# Altium footprint library WE-SHC.PcbLib: 139 footprints (part 5 of 10)
Each footprint in its own frame and in the unit in brackets; x right, y up, seen from the top. Pads: shape width x height; smd on the part's side, far side on the other; paste and mask are expansions set on the pad; w line width, h text height; cw(c..) or ccw(c..) is an arc to the next point about the centre after c.
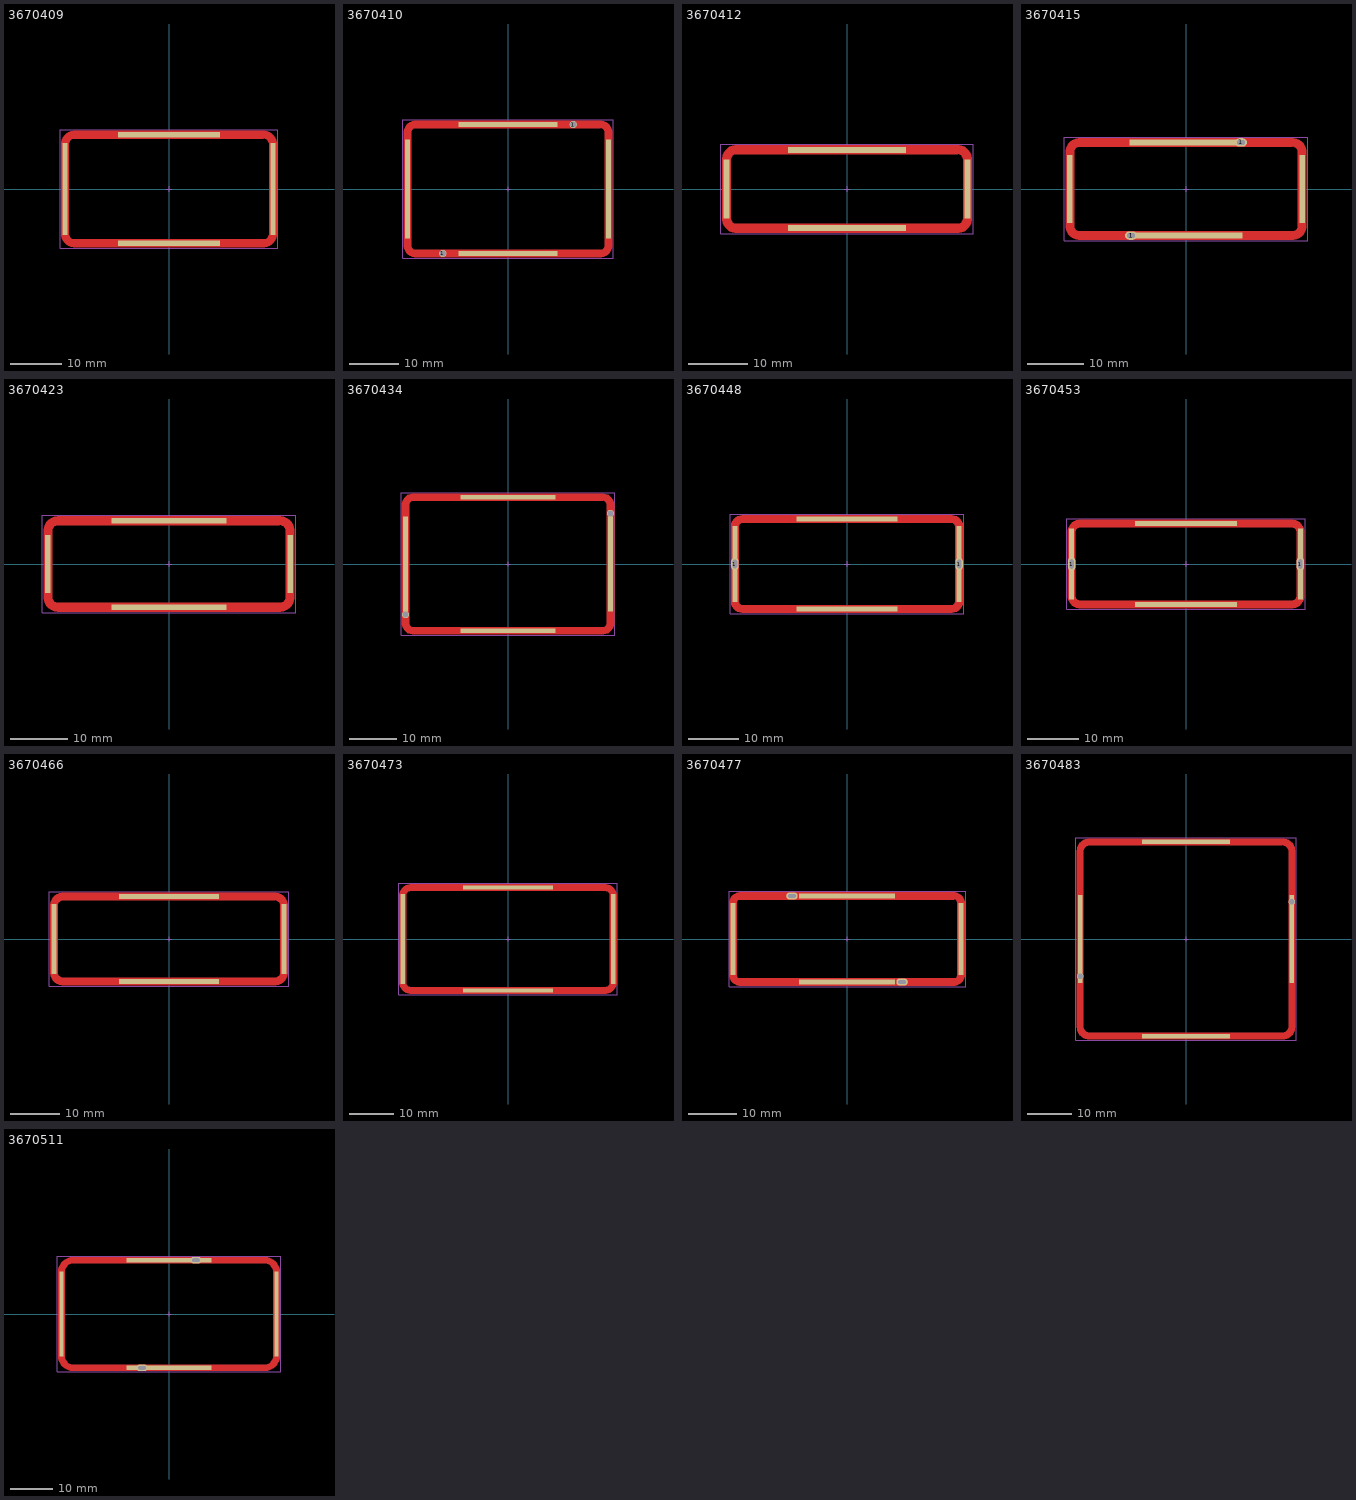
[diagram p4: the footprints below, top view; thin cyan lines are the x and y axes]

## 3670409 [mm] "Shielding Cabinet, SMT Frame Seamless, 40.9x21.5x2.5mm"
height 2.5
pads (4):
  rect 1x18 smd paste-2539.97 mask-2222: 1(-20.3,0) 1(20.3,0)
  rect 20x1 smd paste-2539.97 mask-2222: 1(0,-10.6) 1(0,10.6)
Top Layer:
  region: -21.05,-1 -21.05,8.75 -21.05,9.006 -20.95,9.508 -20.754,9.982 -20.47,10.407 -20.107,10.77 -19.682,11.054 -19.208,11.25 -18.706,11.35 -18.45,11.35 18.45,11.35 18.706,11.35 19.208,11.25 19.682,11.054 20.107,10.77 20.47,10.407 20.754,9.982 20.95,9.508 21.05,9.006 21.05,8.75 21.05,-1 19.55,-1 19.55,8.75 19.545,8.858 19.503,9.069 19.42,9.269 19.3,9.448 19.148,9.6 18.969,9.72 18.769,9.803 18.558,9.845 18.45,9.85 -18.45,9.85 -18.558,9.845 -18.769,9.803 -18.969,9.72 -19.148,9.6 -19.3,9.448 -19.42,9.269 -19.503,9.069 -19.545,8.858 -19.55,8.75 -19.55,-1
  region: -21.05,-0.25 -21.05,-8.75 -21.05,-9.006 -20.95,-9.508 -20.754,-9.982 -20.47,-10.407 -20.107,-10.77 -19.682,-11.054 -19.208,-11.25 -18.706,-11.35 -18.45,-11.35 18.45,-11.35 18.706,-11.35 19.208,-11.25 19.682,-11.054 20.107,-10.77 20.47,-10.407 20.754,-9.982 20.95,-9.508 21.05,-9.006 21.05,-8.75 21.05,-0.25 19.55,-0.25 19.55,-8.75 19.545,-8.858 19.503,-9.069 19.42,-9.269 19.3,-9.448 19.148,-9.6 18.969,-9.72 18.769,-9.803 18.558,-9.845 18.45,-9.85 -18.45,-9.85 -18.558,-9.845 -18.769,-9.803 -18.969,-9.72 -19.148,-9.6 -19.3,-9.448 -19.42,-9.269 -19.503,-9.069 -19.545,-8.858 -19.55,-8.75 -19.55,-0.25
Top Paste:
  region: -21.05,-0.25 -21.05,-8.75 -21.05,-9.006 -20.95,-9.508 -20.754,-9.982 -20.47,-10.407 -20.107,-10.77 -19.682,-11.054 -19.208,-11.25 -18.706,-11.35 -18.45,-11.35 18.45,-11.35 18.706,-11.35 19.208,-11.25 19.682,-11.054 20.107,-10.77 20.47,-10.407 20.754,-9.982 20.95,-9.508 21.05,-9.006 21.05,-8.75 21.05,-0.25 19.55,-0.25 19.55,-8.75 19.545,-8.858 19.503,-9.069 19.42,-9.269 19.3,-9.448 19.148,-9.6 18.969,-9.72 18.769,-9.803 18.558,-9.845 18.45,-9.85 -18.45,-9.85 -18.558,-9.845 -18.769,-9.803 -18.969,-9.72 -19.148,-9.6 -19.3,-9.448 -19.42,-9.269 -19.503,-9.069 -19.545,-8.858 -19.55,-8.75 -19.55,-0.25
  region: -21.05,0.25 -21.05,8.75 -21.05,9.006 -20.95,9.508 -20.754,9.982 -20.47,10.407 -20.107,10.77 -19.682,11.054 -19.208,11.25 -18.706,11.35 -18.45,11.35 18.45,11.35 18.706,11.35 19.208,11.25 19.682,11.054 20.107,10.77 20.47,10.407 20.754,9.982 20.95,9.508 21.05,9.006 21.05,8.75 21.05,0.25 19.55,0.25 19.55,8.75 19.545,8.858 19.503,9.069 19.42,9.269 19.3,9.448 19.148,9.6 18.969,9.72 18.769,9.803 18.558,9.845 18.45,9.85 -18.45,9.85 -18.558,9.845 -18.769,9.803 -18.969,9.72 -19.148,9.6 -19.3,9.448 -19.42,9.269 -19.503,9.069 -19.545,8.858 -19.55,8.75 -19.55,0.25
Notes:
  text "recommended tin paste thickness=0.5mm / customer to define the final stencil gap" at -6.15,-13 h0.4
Top Designator:
  text ".Designator" at -7.498,-0.5 h1.5
Top Component Outline:
  lines w0.1: -20.45,-8.75 ccw(c-18.45,-8.75) -18.45,-10.75 18.45,-10.75 ccw(c18.45,-8.75) 20.45,-8.75 20.45,8.75 ccw(c18.45,8.75) 18.45,10.75 -18.45,10.75 ccw(c-18.45,8.75) -20.45,8.75 -20.45,-8.75
Top 3D Body:
  lines w0.1: -20.45,-8.75 ccw(c-18.45,-8.75) -18.45,-10.75 18.45,-10.75 ccw(c18.45,-8.75) 20.45,-8.75 20.45,8.75 ccw(c18.45,8.75) 18.45,10.75 -18.45,10.75 ccw(c-18.45,8.75) -20.45,8.75 -20.45,-8.75
Top Courtyard:
  lines w0.05: -0.5,0 0.5,0 ; 0,-0.5 0,0.5 ; -21.25,-11.55 -21.25,11.55 21.25,11.55 21.25,-11.55 -21.25,-11.55
3D body "3670409.stp": height 2.5, standoff 0, extent -20.45,-10.75 20.45,10.75

## 3670410 [mm] "Shielding Cabinet, SMT Frame Seamless, 41x26.4x3.7mm"
height 3.7
pads (6):
  rect 1x20 smd paste-2539.97 mask-2222: 1(-20.35,0) 1(20.35,0)
  round 1.5 hole 1.3: 1(-13.2,-13.05) 1(13.2,13.05)
  rect 20x1 smd paste-2539.97 mask-2222: 1(0,-13.05) 1(0,13.05)
Top Layer:
  region: -21.1,-0.25 -21.1,-11.4 -21.1,-11.636 -21.008,-12.1 -20.827,-12.537 -20.564,-12.93 -20.23,-13.264 -19.837,-13.527 -19.4,-13.708 -18.936,-13.8 -18.7,-13.8 18.7,-13.8 18.936,-13.8 19.4,-13.708 19.837,-13.527 20.23,-13.264 20.564,-12.93 20.827,-12.537 21.008,-12.1 21.1,-11.636 21.1,-11.4 21.1,-0.25 19.6,-0.25 19.6,-11.4 19.596,-11.488 19.561,-11.661 19.494,-11.824 19.396,-11.971 19.271,-12.096 19.124,-12.194 18.961,-12.261 18.788,-12.296 18.7,-12.3 -18.7,-12.3 -18.788,-12.296 -18.961,-12.261 -19.124,-12.194 -19.271,-12.096 -19.396,-11.971 -19.494,-11.824 -19.561,-11.661 -19.596,-11.488 -19.6,-11.4 -19.6,-0.25
  region: -21.1,-1 -21.1,11.4 -21.1,11.636 -21.008,12.1 -20.827,12.537 -20.564,12.93 -20.23,13.264 -19.837,13.527 -19.4,13.708 -18.936,13.8 -18.7,13.8 18.7,13.8 18.936,13.8 19.4,13.708 19.837,13.527 20.23,13.264 20.564,12.93 20.827,12.537 21.008,12.1 21.1,11.636 21.1,11.4 21.1,-1 19.6,-1 19.6,11.4 19.596,11.488 19.561,11.661 19.494,11.824 19.396,11.971 19.271,12.096 19.124,12.194 18.961,12.261 18.788,12.296 18.7,12.3 -18.7,12.3 -18.788,12.296 -18.961,12.261 -19.124,12.194 -19.271,12.096 -19.396,11.971 -19.494,11.824 -19.561,11.661 -19.596,11.488 -19.6,11.4 -19.6,-1
Top Paste:
  region: -21.1,0.25 -21.1,11.4 -21.1,11.636 -21.008,12.1 -20.827,12.537 -20.564,12.93 -20.23,13.264 -19.837,13.527 -19.4,13.708 -18.936,13.8 -18.7,13.8 18.7,13.8 18.936,13.8 19.4,13.708 19.837,13.527 20.23,13.264 20.564,12.93 20.827,12.537 21.008,12.1 21.1,11.636 21.1,11.4 21.1,0.25 19.6,0.25 19.6,11.4 19.596,11.488 19.561,11.661 19.494,11.824 19.396,11.971 19.271,12.096 19.124,12.194 18.961,12.261 18.788,12.296 18.7,12.3 -18.7,12.3 -18.788,12.296 -18.961,12.261 -19.124,12.194 -19.271,12.096 -19.396,11.971 -19.494,11.824 -19.561,11.661 -19.596,11.488 -19.6,11.4 -19.6,0.25
  region: -21.1,-0.25 -21.1,-11.4 -21.1,-11.636 -21.008,-12.1 -20.827,-12.537 -20.564,-12.93 -20.23,-13.264 -19.837,-13.527 -19.4,-13.708 -18.936,-13.8 -18.7,-13.8 18.7,-13.8 18.936,-13.8 19.4,-13.708 19.837,-13.527 20.23,-13.264 20.564,-12.93 20.827,-12.537 21.008,-12.1 21.1,-11.636 21.1,-11.4 21.1,-0.25 19.6,-0.25 19.6,-11.4 19.596,-11.488 19.561,-11.661 19.494,-11.824 19.396,-11.971 19.271,-12.096 19.124,-12.194 18.961,-12.261 18.788,-12.296 18.7,-12.3 -18.7,-12.3 -18.788,-12.296 -18.961,-12.261 -19.124,-12.194 -19.271,-12.096 -19.396,-11.971 -19.494,-11.824 -19.561,-11.661 -19.596,-11.488 -19.6,-11.4 -19.6,-0.25
Notes:
  text "recommended tin paste thickness=0.5mm / customer to define the final stencil gap" at -6.35,-15.45 h0.4
Top Designator:
  text ".Designator" at -7.498,-0.5 h1.5
Top Component Outline:
  lines w0.1: -20.5,-11.45 ccw(c-18.75,-11.45) -18.75,-13.2 18.75,-13.2 ccw(c18.75,-11.45) 20.5,-11.45 20.5,11.45 ccw(c18.75,11.45) 18.75,13.2 -18.75,13.2 ccw(c-18.75,11.45) -20.5,11.45 -20.5,-11.45
Top 3D Body:
  lines w0.1: -20.5,-11.45 ccw(c-18.75,-11.45) -18.75,-13.2 18.75,-13.2 ccw(c18.75,-11.45) 20.5,-11.45 20.5,11.45 ccw(c18.75,11.45) 18.75,13.2 -18.75,13.2 ccw(c-18.75,11.45) -20.5,11.45 -20.5,-11.45
Top Courtyard:
  lines w0.05: -0.5,0 0.5,0 ; 0,-0.5 0,0.5 ; -21.3,-14 -21.3,14 21.3,14 21.3,-14 -21.3,-14
3D body "3670410.stp": height 3.7, standoff -1, extent -20.5,-13.2 20.5,13.2

## 3670412 [mm] "Shielding Cabinet, SMT Frame Seamless, 41.2x13.6x5.1mm"
height 5.1
pads (4):
  rect 1x10 smd paste-2539.97 mask-2222: 1(-20.45,0) 1(20.45,0)
  rect 20x1 smd paste-2539.97 mask-2222: 1(0,-6.65) 1(0,6.65)
Top Layer:
  region: -21.2,-0.25 -21.2,-5 -21.2,-5.236 -21.108,-5.7 -20.927,-6.137 -20.664,-6.53 -20.33,-6.864 -19.937,-7.127 -19.5,-7.308 -19.036,-7.4 -18.8,-7.4 18.8,-7.4 19.036,-7.4 19.5,-7.308 19.937,-7.127 20.33,-6.864 20.664,-6.53 20.927,-6.137 21.108,-5.7 21.2,-5.236 21.2,-5 21.2,-0.25 19.7,-0.25 19.7,-5 19.696,-5.088 19.661,-5.261 19.594,-5.424 19.496,-5.571 19.371,-5.696 19.224,-5.794 19.061,-5.861 18.888,-5.896 18.8,-5.9 -18.8,-5.9 -18.888,-5.896 -19.061,-5.861 -19.224,-5.794 -19.371,-5.696 -19.496,-5.571 -19.594,-5.424 -19.661,-5.261 -19.696,-5.088 -19.7,-5 -19.7,-0.25
  region: -21.2,-1 -21.2,5 -21.2,5.236 -21.108,5.7 -20.927,6.137 -20.664,6.53 -20.33,6.864 -19.937,7.127 -19.5,7.308 -19.036,7.4 -18.8,7.4 18.8,7.4 19.036,7.4 19.5,7.308 19.937,7.127 20.33,6.864 20.664,6.53 20.927,6.137 21.108,5.7 21.2,5.236 21.2,5 21.2,-1 19.7,-1 19.7,5 19.696,5.088 19.661,5.261 19.594,5.424 19.496,5.571 19.371,5.696 19.224,5.794 19.061,5.861 18.888,5.896 18.8,5.9 -18.8,5.9 -18.888,5.896 -19.061,5.861 -19.224,5.794 -19.371,5.696 -19.496,5.571 -19.594,5.424 -19.661,5.261 -19.696,5.088 -19.7,5 -19.7,-1
Top Paste:
  region: -21.2,0.25 -21.2,5 -21.2,5.236 -21.108,5.7 -20.927,6.137 -20.664,6.53 -20.33,6.864 -19.937,7.127 -19.5,7.308 -19.036,7.4 -18.8,7.4 18.8,7.4 19.036,7.4 19.5,7.308 19.937,7.127 20.33,6.864 20.664,6.53 20.927,6.137 21.108,5.7 21.2,5.236 21.2,5 21.2,0.25 19.7,0.25 19.7,5 19.696,5.088 19.661,5.261 19.594,5.424 19.496,5.571 19.371,5.696 19.224,5.794 19.061,5.861 18.888,5.896 18.8,5.9 -18.8,5.9 -18.888,5.896 -19.061,5.861 -19.224,5.794 -19.371,5.696 -19.496,5.571 -19.594,5.424 -19.661,5.261 -19.696,5.088 -19.7,5 -19.7,0.25
  region: -21.2,-0.25 -21.2,-5 -21.2,-5.236 -21.108,-5.7 -20.927,-6.137 -20.664,-6.53 -20.33,-6.864 -19.937,-7.127 -19.5,-7.308 -19.036,-7.4 -18.8,-7.4 18.8,-7.4 19.036,-7.4 19.5,-7.308 19.937,-7.127 20.33,-6.864 20.664,-6.53 20.927,-6.137 21.108,-5.7 21.2,-5.236 21.2,-5 21.2,-0.25 19.7,-0.25 19.7,-5 19.696,-5.088 19.661,-5.261 19.594,-5.424 19.496,-5.571 19.371,-5.696 19.224,-5.794 19.061,-5.861 18.888,-5.896 18.8,-5.9 -18.8,-5.9 -18.888,-5.896 -19.061,-5.861 -19.224,-5.794 -19.371,-5.696 -19.496,-5.571 -19.594,-5.424 -19.661,-5.261 -19.696,-5.088 -19.7,-5 -19.7,-0.25
Notes:
  text "recommended tin paste thickness=0.5mm / customer to define the final stencil gap" at -5.65,-9 h0.4
Top Designator:
  text ".Designator" at -7.498,-0.5 h1.5
Top Component Outline:
  lines w0.1: -20.6,-5.05 ccw(c-18.85,-5.05) -18.85,-6.8 18.85,-6.8 ccw(c18.85,-5.05) 20.6,-5.05 20.6,5.05 ccw(c18.85,5.05) 18.85,6.8 -18.85,6.8 ccw(c-18.85,5.05) -20.6,5.05 -20.6,-5.05
Top 3D Body:
  lines w0.1: -20.6,-5.05 ccw(c-18.85,-5.05) -18.85,-6.8 18.85,-6.8 ccw(c18.85,-5.05) 20.6,-5.05 20.6,5.05 ccw(c18.85,5.05) 18.85,6.8 -18.85,6.8 ccw(c-18.85,5.05) -20.6,5.05 -20.6,-5.05
Top Courtyard:
  lines w0.05: -0.5,0 0.5,0 ; 0,-0.5 0,0.5 ; -21.4,-7.6 -21.4,7.6 21.4,7.6 21.4,-7.6 -21.4,-7.6
3D body "3670412.stp": height 5.1, standoff 0, extent -20.6,-6.8 20.6,6.8

## 3670415 [mm] "Shielding Cabinet, SMT Frame Seamless, 41.5x16.8x6.8mm"
height 6.8
pads (6):
  rect 1x12 smd paste-2539.97 mask-2222: 1(-20.6,0) 1(20.6,0)
  oval 2.1x1.5 hole 0.8 slot 1.4 at 0 deg: 1(-9.75,-8.25) 1(9.75,8.25)
  rect 20x1 smd paste-2539.97 mask-2222: 1(0,-8.25) 1(0,8.25)
Top Layer:
  region: -21.35,-1 -21.35,6.5 -21.35,6.746 -21.254,7.229 -21.065,7.684 -20.792,8.094 -20.444,8.442 -20.034,8.715 -19.579,8.904 -19.096,9 -18.85,9 18.85,9 19.096,9 19.579,8.904 20.034,8.715 20.444,8.442 20.792,8.094 21.065,7.684 21.254,7.229 21.35,6.746 21.35,6.5 21.35,-1 19.85,-1 19.85,6.5 19.845,6.598 19.807,6.79 19.732,6.971 19.623,7.134 19.484,7.273 19.321,7.382 19.14,7.457 18.948,7.495 18.85,7.5 -18.85,7.5 -18.948,7.495 -19.14,7.457 -19.321,7.382 -19.484,7.273 -19.623,7.134 -19.732,6.971 -19.807,6.79 -19.845,6.598 -19.85,6.5 -19.85,-1
  region: -21.35,-0.25 -21.35,-6.5 -21.35,-6.746 -21.254,-7.229 -21.065,-7.684 -20.792,-8.094 -20.444,-8.442 -20.034,-8.715 -19.579,-8.904 -19.096,-9 -18.85,-9 18.85,-9 19.096,-9 19.579,-8.904 20.034,-8.715 20.444,-8.442 20.792,-8.094 21.065,-7.684 21.254,-7.229 21.35,-6.746 21.35,-6.5 21.35,-0.25 19.85,-0.25 19.85,-6.5 19.845,-6.598 19.807,-6.79 19.732,-6.971 19.623,-7.134 19.484,-7.273 19.321,-7.382 19.14,-7.457 18.948,-7.495 18.85,-7.5 -18.85,-7.5 -18.948,-7.495 -19.14,-7.457 -19.321,-7.382 -19.484,-7.273 -19.623,-7.134 -19.732,-6.971 -19.807,-6.79 -19.845,-6.598 -19.85,-6.5 -19.85,-0.25
Top Paste:
  region: -21.35,-0.25 -21.35,-6.5 -21.35,-6.746 -21.254,-7.229 -21.065,-7.684 -20.792,-8.094 -20.444,-8.442 -20.034,-8.715 -19.579,-8.904 -19.096,-9 -18.85,-9 18.85,-9 19.096,-9 19.579,-8.904 20.034,-8.715 20.444,-8.442 20.792,-8.094 21.065,-7.684 21.254,-7.229 21.35,-6.746 21.35,-6.5 21.35,-0.25 19.85,-0.25 19.85,-6.5 19.845,-6.598 19.807,-6.79 19.732,-6.971 19.623,-7.134 19.484,-7.273 19.321,-7.382 19.14,-7.457 18.948,-7.495 18.85,-7.5 -18.85,-7.5 -18.948,-7.495 -19.14,-7.457 -19.321,-7.382 -19.484,-7.273 -19.623,-7.134 -19.732,-6.971 -19.807,-6.79 -19.845,-6.598 -19.85,-6.5 -19.85,-0.25
  region: -21.35,0.25 -21.35,6.5 -21.35,6.746 -21.254,7.229 -21.065,7.684 -20.792,8.094 -20.444,8.442 -20.034,8.715 -19.579,8.904 -19.096,9 -18.85,9 18.85,9 19.096,9 19.579,8.904 20.034,8.715 20.444,8.442 20.792,8.094 21.065,7.684 21.254,7.229 21.35,6.746 21.35,6.5 21.35,0.25 19.85,0.25 19.85,6.5 19.845,6.598 19.807,6.79 19.732,6.971 19.623,7.134 19.484,7.273 19.321,7.382 19.14,7.457 18.948,7.495 18.85,7.5 -18.85,7.5 -18.948,7.495 -19.14,7.457 -19.321,7.382 -19.484,7.273 -19.623,7.134 -19.732,6.971 -19.807,6.79 -19.845,6.598 -19.85,6.5 -19.85,0.25
Notes:
  text "recommended tin paste thickness=0.5mm / customer to define the final stencil gap" at -5.6,-10.7 h0.4
Top Designator:
  text ".Designator" at -7.498,-0.5 h1.5
Top Component Outline:
  lines w0.1: -20.75,-6.4 ccw(c-18.75,-6.4) -18.75,-8.4 18.75,-8.4 ccw(c18.75,-6.4) 20.75,-6.4 20.75,6.4 ccw(c18.75,6.4) 18.75,8.4 -18.75,8.4 ccw(c-18.75,6.4) -20.75,6.4 -20.75,-6.4
Top 3D Body:
  lines w0.1: -20.75,-6.4 ccw(c-18.75,-6.4) -18.75,-8.4 18.75,-8.4 ccw(c18.75,-6.4) 20.75,-6.4 20.75,6.4 ccw(c18.75,6.4) 18.75,8.4 -18.75,8.4 ccw(c-18.75,6.4) -20.75,6.4 -20.75,-6.4
Top Courtyard:
  lines w0.05: -0.5,0 0.5,0 ; 0,-0.5 0,0.5 ; -21.55,-9.2 -21.55,9.2 21.55,9.2 21.55,-9.2 -21.55,-9.2
3D body "3670415.stp": height 6.8, standoff -1.2, extent -20.75,-8.4 20.75,8.4

## 3670423 [mm] "Shielding Cabinet, SMT Frame Seamless, 42.3x15.3x4.4mm"
height 4.4
pads (4):
  rect 1x10 smd paste-2539.97 mask-2222: 1(-21,0) 1(21,0)
  rect 20x1 smd paste-2539.97 mask-2222: 1(0,-7.5) 1(0,7.5)
Top Layer:
  region: -21.75,-1 -21.75,5.65 -21.75,5.906 -21.65,6.408 -21.454,6.882 -21.17,7.307 -20.807,7.67 -20.382,7.954 -19.908,8.15 -19.406,8.25 -19.15,8.25 19.15,8.25 19.406,8.25 19.908,8.15 20.382,7.954 20.807,7.67 21.17,7.307 21.454,6.882 21.65,6.408 21.75,5.906 21.75,5.65 21.75,-1 20.25,-1 20.25,5.65 20.245,5.758 20.203,5.969 20.12,6.169 20,6.348 19.848,6.5 19.669,6.62 19.469,6.703 19.258,6.745 19.15,6.75 -19.15,6.75 -19.258,6.745 -19.469,6.703 -19.669,6.62 -19.848,6.5 -20,6.348 -20.12,6.169 -20.203,5.969 -20.245,5.758 -20.25,5.65 -20.25,-1
  region: -21.75,-0.25 -21.75,-5.65 -21.75,-5.906 -21.65,-6.408 -21.454,-6.882 -21.17,-7.307 -20.807,-7.67 -20.382,-7.954 -19.908,-8.15 -19.406,-8.25 -19.15,-8.25 19.15,-8.25 19.406,-8.25 19.908,-8.15 20.382,-7.954 20.807,-7.67 21.17,-7.307 21.454,-6.882 21.65,-6.408 21.75,-5.906 21.75,-5.65 21.75,-0.25 20.25,-0.25 20.25,-5.65 20.245,-5.758 20.203,-5.969 20.12,-6.169 20,-6.348 19.848,-6.5 19.669,-6.62 19.469,-6.703 19.258,-6.745 19.15,-6.75 -19.15,-6.75 -19.258,-6.745 -19.469,-6.703 -19.669,-6.62 -19.848,-6.5 -20,-6.348 -20.12,-6.169 -20.203,-5.969 -20.245,-5.758 -20.25,-5.65 -20.25,-0.25
Top Paste:
  region: -21.75,-0.25 -21.75,-5.65 -21.75,-5.906 -21.65,-6.408 -21.454,-6.882 -21.17,-7.307 -20.807,-7.67 -20.382,-7.954 -19.908,-8.15 -19.406,-8.25 -19.15,-8.25 19.15,-8.25 19.406,-8.25 19.908,-8.15 20.382,-7.954 20.807,-7.67 21.17,-7.307 21.454,-6.882 21.65,-6.408 21.75,-5.906 21.75,-5.65 21.75,-0.25 20.25,-0.25 20.25,-5.65 20.245,-5.758 20.203,-5.969 20.12,-6.169 20,-6.348 19.848,-6.5 19.669,-6.62 19.469,-6.703 19.258,-6.745 19.15,-6.75 -19.15,-6.75 -19.258,-6.745 -19.469,-6.703 -19.669,-6.62 -19.848,-6.5 -20,-6.348 -20.12,-6.169 -20.203,-5.969 -20.245,-5.758 -20.25,-5.65 -20.25,-0.25
  region: -21.75,0.25 -21.75,5.65 -21.75,5.906 -21.65,6.408 -21.454,6.882 -21.17,7.307 -20.807,7.67 -20.382,7.954 -19.908,8.15 -19.406,8.25 -19.15,8.25 19.15,8.25 19.406,8.25 19.908,8.15 20.382,7.954 20.807,7.67 21.17,7.307 21.454,6.882 21.65,6.408 21.75,5.906 21.75,5.65 21.75,0.25 20.25,0.25 20.25,5.65 20.245,5.758 20.203,5.969 20.12,6.169 20,6.348 19.848,6.5 19.669,6.62 19.469,6.703 19.258,6.745 19.15,6.75 -19.15,6.75 -19.258,6.745 -19.469,6.703 -19.669,6.62 -19.848,6.5 -20,6.348 -20.12,6.169 -20.203,5.969 -20.245,5.758 -20.25,5.65 -20.25,0.25
Notes:
  text "recommended tin paste thickness=0.5mm / customer to define the final stencil gap" at -5.9,-9.85 h0.4
Top Designator:
  text ".Designator" at -7.498,-0.5 h1.5
Top Component Outline:
  lines w0.1: -21.15,-5.65 ccw(c-19.15,-5.65) -19.15,-7.65 19.15,-7.65 ccw(c19.15,-5.65) 21.15,-5.65 21.15,5.65 ccw(c19.15,5.65) 19.15,7.65 -19.15,7.65 ccw(c-19.15,5.65) -21.15,5.65 -21.15,-5.65
Top 3D Body:
  lines w0.1: -21.15,-5.65 ccw(c-19.15,-5.65) -19.15,-7.65 19.15,-7.65 ccw(c19.15,-5.65) 21.15,-5.65 21.15,5.65 ccw(c19.15,5.65) 19.15,7.65 -19.15,7.65 ccw(c-19.15,5.65) -21.15,5.65 -21.15,-5.65
Top Courtyard:
  lines w0.05: -0.5,0 0.5,0 ; 0,-0.5 0,0.5 ; -21.95,-8.45 -21.95,8.45 21.95,8.45 21.95,-8.45 -21.95,-8.45
3D body "3670423.stp": height 4.4, standoff 0, extent -21.15,-7.65 21.15,7.65

## 3670434 [mm] "Shielding Cabinet, SMT Frame Seamless, 43.4x28.4x3.3mm"
height 3.3
pads (6):
  round 1.5 hole 1.3: 1(-21.55,-10.65) 1(21.55,10.65)
  rect 1x20 smd paste-2539.97 mask-2222: 1(-21.55,0) 1(21.55,0)
  rect 20x1 smd paste-2539.97 mask-2222: 1(0,-14.05) 1(0,14.05)
Top Layer:
  region: -22.3,-1 -22.3,12.4 -22.3,12.636 -22.208,13.1 -22.027,13.537 -21.764,13.93 -21.43,14.264 -21.037,14.527 -20.6,14.708 -20.136,14.8 -19.9,14.8 19.9,14.8 20.136,14.8 20.6,14.708 21.037,14.527 21.43,14.264 21.764,13.93 22.027,13.537 22.208,13.1 22.3,12.636 22.3,12.4 22.3,-1 20.8,-1 20.8,12.4 20.796,12.488 20.761,12.661 20.694,12.824 20.596,12.971 20.471,13.096 20.324,13.194 20.161,13.261 19.988,13.296 19.9,13.3 -19.9,13.3 -19.988,13.296 -20.161,13.261 -20.324,13.194 -20.471,13.096 -20.596,12.971 -20.694,12.824 -20.761,12.661 -20.796,12.488 -20.8,12.4 -20.8,-1
  region: -22.3,-0.25 -22.3,-12.4 -22.3,-12.636 -22.208,-13.1 -22.027,-13.537 -21.764,-13.93 -21.43,-14.264 -21.037,-14.527 -20.6,-14.708 -20.136,-14.8 -19.9,-14.8 19.9,-14.8 20.136,-14.8 20.6,-14.708 21.037,-14.527 21.43,-14.264 21.764,-13.93 22.027,-13.537 22.208,-13.1 22.3,-12.636 22.3,-12.4 22.3,-0.25 20.8,-0.25 20.8,-12.4 20.796,-12.488 20.761,-12.661 20.694,-12.824 20.596,-12.971 20.471,-13.096 20.324,-13.194 20.161,-13.261 19.988,-13.296 19.9,-13.3 -19.9,-13.3 -19.988,-13.296 -20.161,-13.261 -20.324,-13.194 -20.471,-13.096 -20.596,-12.971 -20.694,-12.824 -20.761,-12.661 -20.796,-12.488 -20.8,-12.4 -20.8,-0.25
Top Paste:
  region: -22.3,-0.25 -22.3,-12.4 -22.3,-12.636 -22.208,-13.1 -22.027,-13.537 -21.764,-13.93 -21.43,-14.264 -21.037,-14.527 -20.6,-14.708 -20.136,-14.8 -19.9,-14.8 19.9,-14.8 20.136,-14.8 20.6,-14.708 21.037,-14.527 21.43,-14.264 21.764,-13.93 22.027,-13.537 22.208,-13.1 22.3,-12.636 22.3,-12.4 22.3,-0.25 20.8,-0.25 20.8,-12.4 20.796,-12.488 20.761,-12.661 20.694,-12.824 20.596,-12.971 20.471,-13.096 20.324,-13.194 20.161,-13.261 19.988,-13.296 19.9,-13.3 -19.9,-13.3 -19.988,-13.296 -20.161,-13.261 -20.324,-13.194 -20.471,-13.096 -20.596,-12.971 -20.694,-12.824 -20.761,-12.661 -20.796,-12.488 -20.8,-12.4 -20.8,-0.25
  region: -22.3,0.25 -22.3,12.4 -22.3,12.636 -22.208,13.1 -22.027,13.537 -21.764,13.93 -21.43,14.264 -21.037,14.527 -20.6,14.708 -20.136,14.8 -19.9,14.8 19.9,14.8 20.136,14.8 20.6,14.708 21.037,14.527 21.43,14.264 21.764,13.93 22.027,13.537 22.208,13.1 22.3,12.636 22.3,12.4 22.3,0.25 20.8,0.25 20.8,12.4 20.796,12.488 20.761,12.661 20.694,12.824 20.596,12.971 20.471,13.096 20.324,13.194 20.161,13.261 19.988,13.296 19.9,13.3 -19.9,13.3 -19.988,13.296 -20.161,13.261 -20.324,13.194 -20.471,13.096 -20.596,12.971 -20.694,12.824 -20.761,12.661 -20.796,12.488 -20.8,12.4 -20.8,0.25
Notes:
  text "recommended tin paste thickness=0.5mm / customer to define the final stencil gap" at -5.95,-16.5 h0.4
Top Designator:
  text ".Designator" at -7.498,-0.5 h1.5
Top Component Outline:
  lines w0.1: -21.7,-12.45 ccw(c-19.95,-12.45) -19.95,-14.2 19.95,-14.2 ccw(c19.95,-12.45) 21.7,-12.45 21.7,12.45 ccw(c19.95,12.45) 19.95,14.2 -19.95,14.2 ccw(c-19.95,12.45) -21.7,12.45 -21.7,-12.45
Top 3D Body:
  lines w0.1: -21.7,-12.45 ccw(c-19.95,-12.45) -19.95,-14.2 19.95,-14.2 ccw(c19.95,-12.45) 21.7,-12.45 21.7,12.45 ccw(c19.95,12.45) 19.95,14.2 -19.95,14.2 ccw(c-19.95,12.45) -21.7,12.45 -21.7,-12.45
Top Courtyard:
  lines w0.05: -0.5,0 0.5,0 ; 0,-0.5 0,0.5 ; -22.5,-15 22.5,-15 22.5,15 -22.5,15 -22.5,-15
3D body "3670434.stp": height 3.3, standoff -1, extent -21.7,-14.2 21.7,14.2
